# Altium footprint library Conectori.PcbLib: 65 footprints (part 2 of 5)
Each footprint in its own frame and in the unit in brackets; x right, y up, seen from the top. Pads: shape width x height; smd on the part's side, far side on the other; paste and mask are expansions set on the pad; w line width, h text height; cw(c..) or ccw(c..) is an arc to the next point about the centre after c.
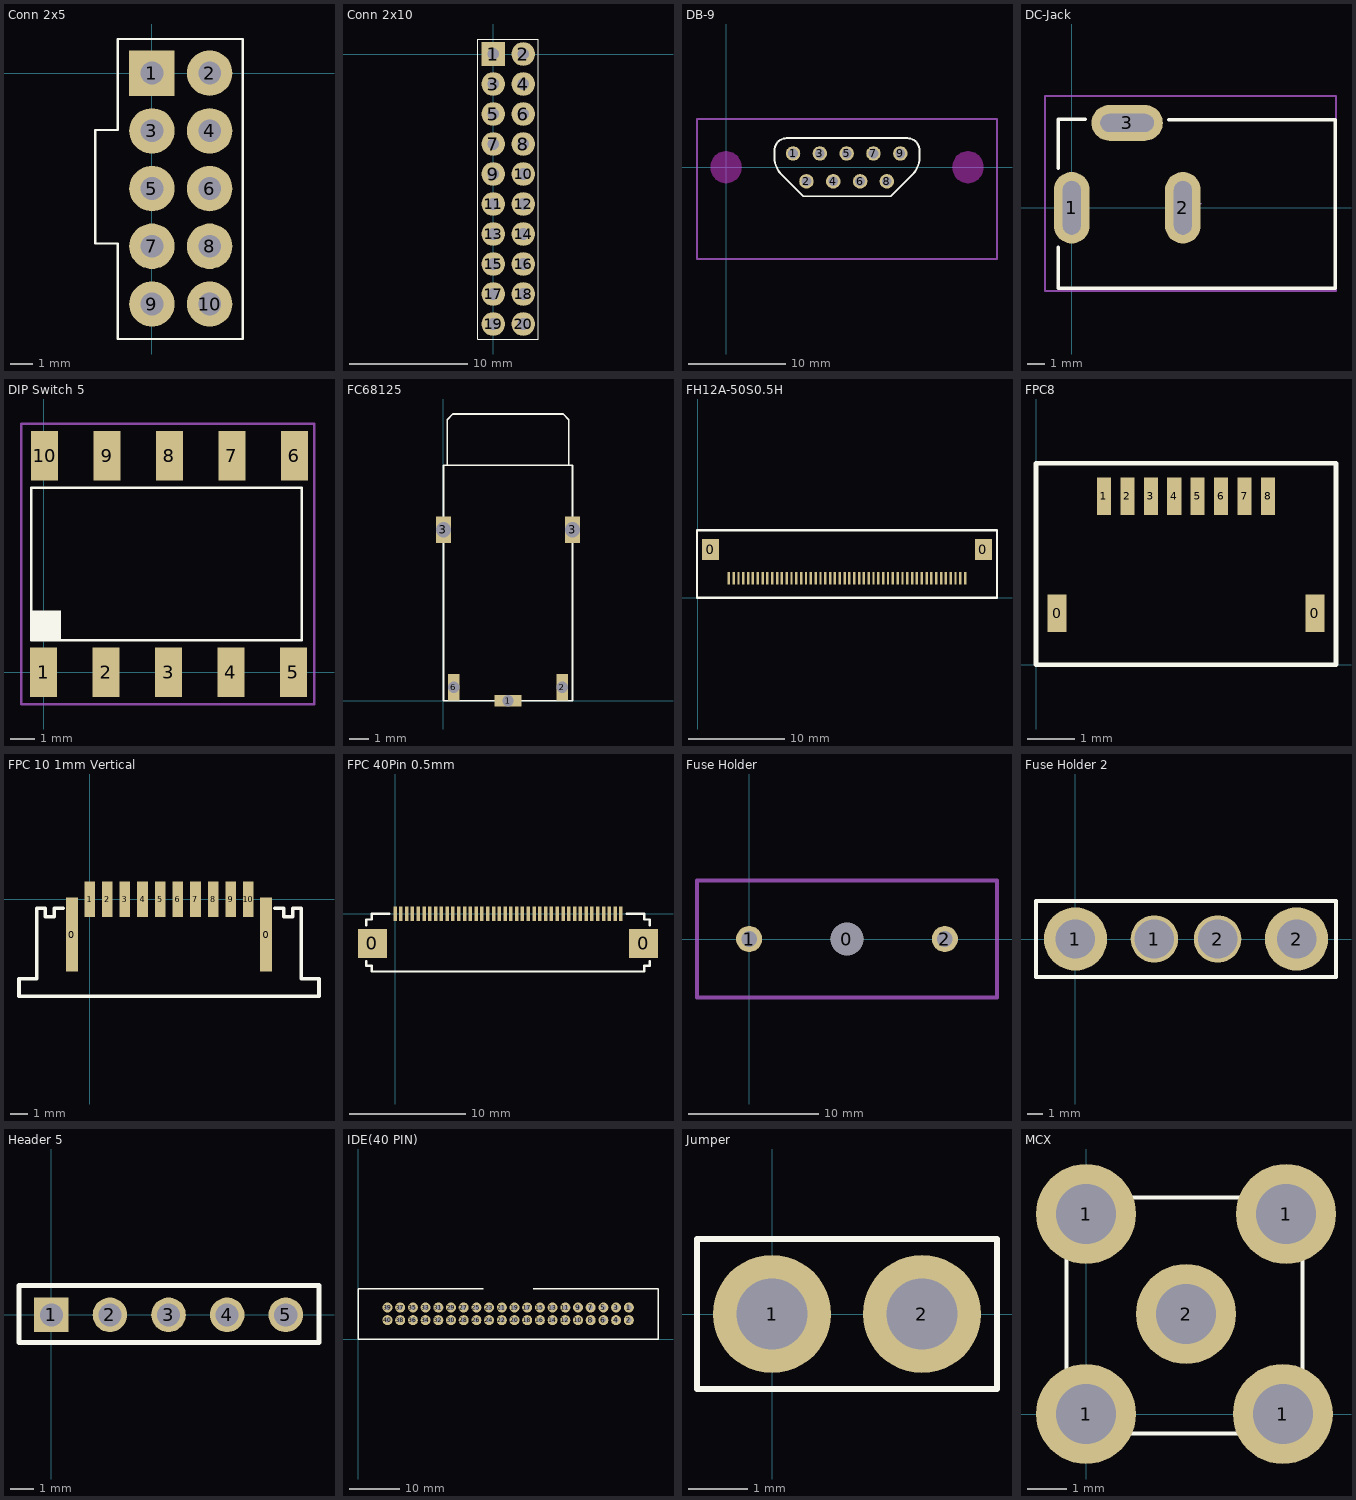
[diagram p1: the footprints below, top view; thin cyan lines are the x and y axes]

## Conn 2x5 [mm]
pads (10):
  rect 2x2 hole 1: 1(0,0)
  round 2 hole 1: 2(2.54,0) 3(0,-2.54) 4(2.54,-2.54) 5(0,-5.08) 6(2.54,-5.08) 7(0,-7.62) 8(2.54,-7.62) 9(0,-10.16) 10(2.54,-10.16)
Top Overlay:
  lines w0.1: -2.5,-7.5 -2.5,-2.5 -1.5,-2.5 -1.5,1.5 4,1.5 4,-11.7 -1.5,-11.7 -1.5,-7.5 -2.5,-7.5

## Conn 2x10 [mm]
pads (20):
  rect 2x2 hole 1: 1(0,0)
  round 2 hole 1: 2(2.54,0) 3(0,-2.54) 4(2.54,-2.54) 5(0,-5.08) 6(2.54,-5.08) 7(0,-7.62) 8(2.54,-7.62) 9(0,-10.16) 10(2.54,-10.16) 11(0,-12.7) 12(2.54,-12.7) 13(0,-15.24) 14(2.54,-15.24) 15(0,-17.78) 16(2.54,-17.78) 17(0,-20.32) 18(2.54,-20.32) 19(0,-22.86) 20(2.54,-22.86)
Top Overlay:
  lines w0.1: -1.3,-24.13 -1.3,-8.8 -1.3,1.27 3.8,1.27 3.8,-24.13 -1.3,-24.13

## DB-9 [mm]
pads (9):
  round 1.5 hole 1: 1(6.925,1.42) 2(8.31,-1.46) 3(9.695,1.42) 4(11.08,-1.46) 5(12.465,1.42) 6(13.85,-1.46) 7(15.235,1.42) 8(16.62,-1.46) 9(18.005,1.42)
Top Overlay:
  lines w0.2: 5,1 ccw(c7.414,1) 5.707,-0.707 8,-3 17,-3 19.293,-0.707 ccw(c17.586,1) 20,1 20,1.73 ccw(c18.73,1.73) 18.73,3 6.27,3 ccw(c6.27,1.73) 5,1.73 5,1
Keep-Out Layer:
  circle w2: c25,0 r0.608
  circle w2: c0,0 r0.608
  circle w0.1: c25,0 r1.6
  circle w0.1: c0,0 r1.6
Mechanical 15:
  lines w0.2: -3,-9.5 28,-9.5 28,5 -3,5 -3,-0.5 -3,-9.5
3D body "User Library-DB9-Usa.step": height 12.27, standoff -4.6, extent -2.905,-15.2 27.905,3.1

## DC-Jack [mm]
pads (3):
  oval 2x4 hole 1 slot 3 at 90 deg paste+0 mask+0: 1(0,0) 2(6.216,0)
  oval 4x2 hole 1 slot 3 at 0 deg paste+0 mask+0: 3(3.099,4.75)
Top Overlay:
  lines w0.2: -0.762,-2.2 -0.762,-4.5 14.732,-4.5 14.732,4.928 5.416,4.928 ; -0.762,2.2 -0.762,4.953 0.762,4.953
Mechanical 15:
  lines w0.1: 6.231,0.229 7.231,0.229 ; 6.731,-0.271 6.731,0.729 ; -1.5,-4.648 14.783,-4.648 14.783,6.25 -1.5,6.25 -1.5,-4.648
3D body "User Library-Kobiconn_Lockable_DC_jack_161-0721-EX.step": height 11.1, standoff -3.4, extent -0.686,-4.475 14.614,4.881

## DIP Switch 5 [mm]
height 3.7
pads (10):
  rect 1.1x2 smd: 1(0,0) 2(2.54,0) 3(5.08,0) 4(7.62,0) 5(10.16,0) 6(10.2,8.8) 7(7.66,8.8) 8(5.12,8.8) 9(2.58,8.8) 10(0.04,8.8)
Top Overlay:
  rectangle: -0.5,1.3 0.7,2.5
  lines w0.1: -0.5,1.3 -0.5,7.5 10.5,7.5 10.5,1.3 -0.5,1.3
Mechanical 15:
  lines w0.1: -0.9,-1.3 -0.9,-0.2 -0.9,9.8 -0.9,10.1 -0.8,10.1 11,10.1 11,9.5 11,-1.3 -0.9,-1.3
3D body "User Library-DIP-Schalter SMD 5polig RM2 54.step": height 3.3, standoff -0.9, extent -1.25,0.6 11.45,8.22

## FC68125 [mm] "3.5mm Audio Connector"
height 6
pads (5):
  rect 1.4x0.6 hole 0.6 square: 1(3.4,0)
  rect 0.6x1.4 hole 0.6 square: 2(6.25,0.7) 6(0.55,0.7)
  rect 0.8x1.4 hole 0.8 square: 3(0,9) 3(6.8,9)
Top Overlay:
  lines w0.1: 6.6,12.4 6.6,12.6 6.6,14.8 6.3,15.1 1.3,15.1 0.5,15.1 0.2,14.8 0.2,12.4 ; 0.2,12.4 0,12.4 0,0 6.8,0 6.8,12.4 0.2,12.4

## FH12A-50S0.5H [mm] "Conector pentru Display"
height 2
pads (52):
  rect 1.8x2.2 smd: 0(1.3,5) 0(29.6,5)
  rect 0.25x1.3 smd: 1(3.2,2) 2(3.7,2) 3(4.2,2) 4(4.7,2) 5(5.2,2) 6(5.7,2) 7(6.2,2) 8(6.7,2) 9(7.2,2) 10(7.7,2) 11(8.2,2) 12(8.7,2) 13(9.2,2) 14(9.7,2) 15(10.2,2) 16(10.7,2) 17(11.2,2) 18(11.7,2) 19(12.2,2) 20(12.7,2) 21(13.2,2) 22(13.7,2) 23(14.2,2) 24(14.7,2) 25(15.2,2) 26(15.7,2) 27(16.2,2) 28(16.7,2) 29(17.2,2) 30(17.7,2) 31(18.2,2) 32(18.7,2) 33(19.2,2) 34(19.7,2) 35(20.2,2) 36(20.7,2) 37(21.2,2) 38(21.7,2) 39(22.2,2) 40(22.7,2) 41(23.2,2) 42(23.7,2) 43(24.2,2) 44(24.7,2) 45(25.2,2) 46(25.7,2) 47(26.2,2) 48(26.7,2) 49(27.2,2) 50(27.7,2)
Top Overlay:
  lines w0.254: -0.1,0 31,0 31,7 -0.1,7 -0.1,0.1

## FPC8 [mm]
pads (10):
  rect 0.4x0.8 smd: 0(0.45,1.1) 0(5.95,1.1)
  rect 0.3x0.8 smd: 1(1.45,3.6) 2(1.95,3.6) 3(2.45,3.6) 4(2.95,3.6) 5(3.45,3.6) 6(3.95,3.6) 7(4.45,3.6) 8(4.95,3.6)
Top Overlay:
  lines w0.1: 0,0 0,4.3 6.4,4.3 6.4,0 0,0

## FPC 10 1mm Vertical [mm]
pads (12):
  rect 0.7x4.2 smd: 0(-1,-2) 0(10,-2)
  rect 0.6x2 smd: 1(0,0) 2(1,0) 3(2,0) 4(3,0) 5(4,0) 6(5,0) 7(6,0) 8(7,0) 9(8,0) 10(9,0)
Top Overlay:
  lines w0.2: -1.5,-0.5 -2,-0.5 -2,-1 -2.5,-1 -2.5,-0.5 -3,-0.5 -3,-4.5 -4,-4.5 -4,-5.5 11.5,-5.5 13,-5.5 13,-4.5 12,-4.5 12,-0.5 11.5,-0.5 11.5,-1 11,-1 11,-0.5 10.5,-0.5
3D body: height 2, standoff 0, extent -4,-5.5 13,-0.5

## FPC 40Pin 0.5mm [mm]
height 3
pads (42):
  rect 2.5x2.5 smd: 0(-1.95,-2.575) 0(21.45,-2.575)
  rect 0.3x1.25 smd mask+0.08: 1(0,0) 2(0.5,0) 3(1,0) 4(1.5,0) 5(2,0) 6(2.5,0) 7(3,0) 8(3.5,0) 9(4,0) 10(4.5,0) 11(5,0) 12(5.5,0) 13(6,0) 14(6.5,0) 15(7,0) 16(7.5,0) 17(8,0) 18(8.5,0) 19(9,0) 20(9.5,0) 21(10,0) 22(10.5,0) 23(11,0) 24(11.5,0) 25(12,0) 26(12.5,0) 27(13,0) 28(13.5,0) 29(14,0) 30(14.5,0) 31(15,0) 32(15.5,0) 33(16,0) 34(16.5,0) 35(17,0) 36(17.5,0) 37(18,0) 38(18.5,0) 39(19,0) 40(19.5,0)
Top Overlay:
  lines w0.2: -2.5,-4.1 -2.5,-4.5 -2,-4.5 -2,-5 21.5,-5 21.5,-4.5 22,-4.5 22,-4.1 ; -2.5,-1 -2.5,-0.5 -2,-0.5 -2,0 -0.5,0 ; 20,0 21,0 21.5,0 21.5,-0.5 22,-0.5 22,-1
3D body "5804.stp": height 2, standoff -0.05, extent -3,-6.675 22.5,0.475

## Fuse Holder [mm] "Cartridge Fuse Holder"
pads (3):
  round 2.5 hole 2.5: 0(7.5,0)
  round 2 hole 1.2: 1(0,0) 2(15,0)
Mechanical 15:
  lines w0.3: -4,-4.5 19,-4.5 19,4.5 -4,4.5 -4,-4.5

## Fuse Holder 2 [mm]
pads (4):
  round 4 hole 2.5: 1(0,0) 2(14,0)
  round 3 hole 2.5: 1(5,0) 2(9,0)
Top Overlay:
  lines w0.254: -2.5,-2.4 -2.5,2.4 16.5,2.4 16.5,-2.4 -2.5,-2.4

## Header 5 [mm]
pads (5):
  rect 1.5x1.5 hole 1: 1(0,0)
  round 1.5 hole 1: 2(2.54,0) 3(5.08,0) 4(7.62,0) 5(10.16,0)
Top Overlay:
  lines w0.2: -1.4,-1.2 -1.4,1.27 11.6,1.27 11.6,-1.2 -1.4,-1.2
3D body "User Library-Header_Male_5Pin.STEP": height 8.54, standoff -3, extent -1.27,-1.22 11.43,1.27

## IDE(40 PIN) [mm]
height 10
pads (40):
  round 2 hole 1: 1(54.16,6.3) 2(54.16,3.76) 3(51.62,6.3) 4(51.62,3.76) 5(49.08,6.3) 6(49.08,3.76) 7(46.54,6.3) 8(46.54,3.76) 9(44,6.3) 10(44,3.76) 11(41.46,6.3) 12(41.46,3.76) 13(38.92,6.3) 14(38.92,3.76) 15(36.38,6.3) 16(36.38,3.76) 17(33.84,6.3) 18(33.84,3.76) 19(31.3,6.3) 20(31.3,3.76) 21(28.76,6.3) 22(28.76,3.76) 23(26.22,6.3) 24(26.22,3.76) 25(23.68,6.3) 26(23.68,3.76) 27(21.14,6.3) 28(21.14,3.76) 29(18.6,6.3) 30(18.6,3.76) 31(16.06,6.3) 32(16.06,3.76) 33(13.52,6.3) 34(13.52,3.76) 35(10.98,6.3) 36(10.98,3.76) 37(8.44,6.3) 38(8.44,3.76) 39(5.9,6.3) 40(5.9,3.76)
Top Overlay:
  lines w0.254: 25,10 0,10 0,0 60,0 60,10 35,10

## Jumper [mm]
pads (2):
  round 2 hole 1.2: 1(0,0) 2(2.54,0)
Top Overlay:
  lines w0.1: -1.27,-1.27 -1.27,1.27 3.81,1.27 3.81,-1.27 -1.27,-1.27
3D body "User Library-SHORTING JUMPER.step": height 5.95, standoff 0.05, extent -1.34,-1.27 3.74,1.27

## MCX [mil]
pads (5):
  round 100 hole 60: 1(0,0) 1(0,200) 1(196.85,0) 1(200,200) 2(100,100)
Top Overlay:
  lines w3.94: -19.68,-19.68 -19.68,216.54 216.54,216.54 216.54,-19.68 -19.68,-19.68
3D body: height 208.66, standoff 0, extent 12.12,11.59 188.58,188.41
3D body: height 39.37, standoff 0, extent -19.68,-19.69 216.54,216.54